# Altium footprint library uSimar_Components.PcbLib: 17 footprints (part 1 of 2)
Each footprint in its own frame and in the unit in brackets; x right, y up, seen from the top. Pads: shape width x height; smd on the part's side, far side on the other; paste and mask are expansions set on the pad; w line width, h text height; cw(c..) or ccw(c..) is an arc to the next point about the centre after c.
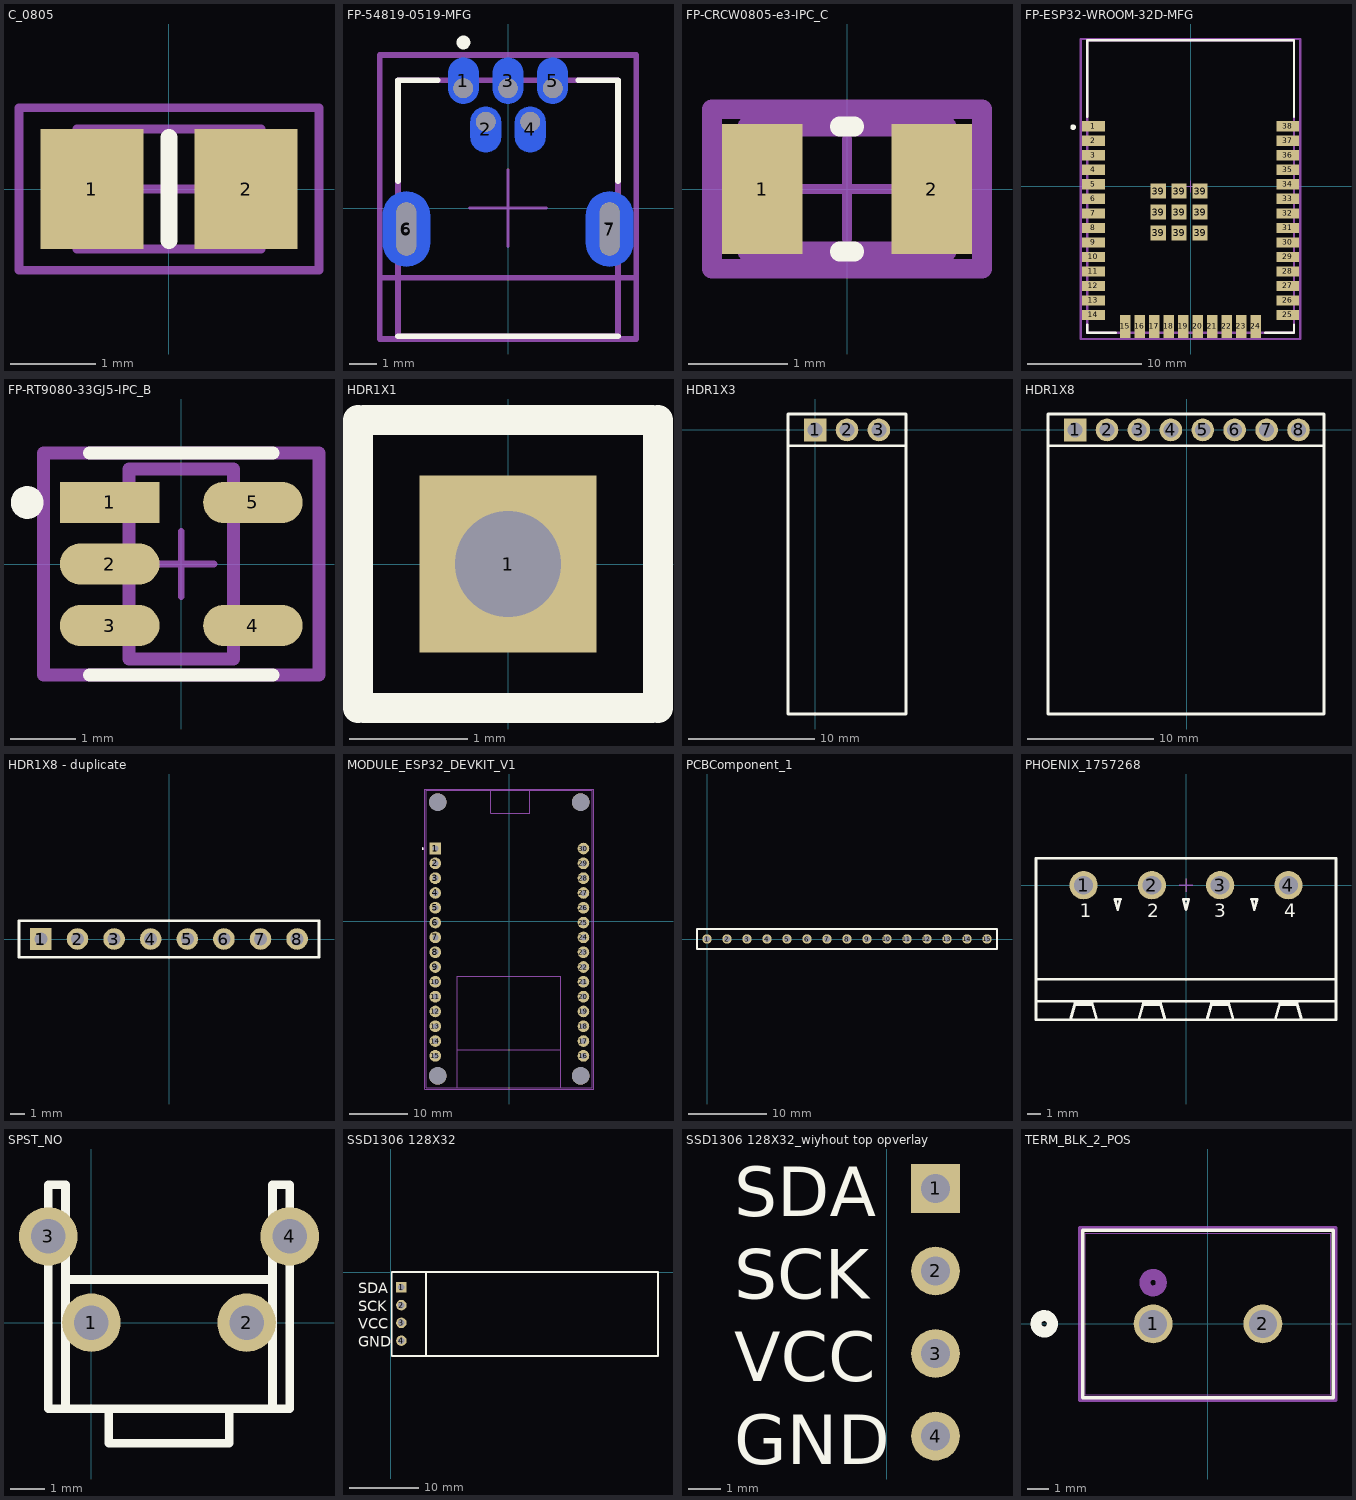
[diagram p0: the footprints below, top view; thin cyan lines are the x and y axes]

## C_0805 [mm] "Chip Capacitor, Body 2.0x1.2mm, IPC Medium Density"
height 0.7
pads (2):
  rect 1.2x1.4 smd: 1(-0.9,0) 2(0.9,0)
Top Overlay:
  lines w0.2: 0,-0.6 0,0.6
Mechanical 13:
  lines w0.1: -1.075,-0.7 -1.075,0.7 1.075,0.7 1.075,-0.7 -1.075,-0.7
Mechanical 15:
  lines w0.1: -0.5,0 0.5,0 ; 0,-0.5 0,0.5 ; -1.75,-0.95 1.75,-0.95 1.75,0.95 -1.75,0.95 -1.75,-0.95
3D body "User Library-C0805-2.step": height 0.8, standoff 0, extent -0.975,-0.625 1.025,0.625

## FP-54819-0519-MFG [mm]
pads (9):
  rrect100% 1.1x1.65 smd far side paste-1000 mask+0: 1(-1.6,4.575) 2(-0.8,2.825) 3(0,4.575) 4(0.8,2.825) 5(1.6,4.575)
  rrect100% 0.7x1.9 hole 1.9 slot 0.7 at 0 deg paste-1000 mask+0: 6(-3.65,-0.75) 7(3.65,-0.75)
  rrect100% 1.7x2.7 smd far side paste-1000 mask+0: 6(-3.65,-0.75) 7(3.65,-0.75)
via 1.6,4.3 diameter 0.7 hole 0.7
via 0.8,3.1 diameter 0.7 hole 0.7
via 0,4.3 diameter 0.7 hole 0.7
via -0.8,3.1 diameter 0.7 hole 0.7
via -1.6,4.3 diameter 0.7 hole 0.7
Top Overlay:
  circle w0.25: c-1.6,5.95 r0.125
  lines w0.2: -3.95,-4.6 3.95,-4.6 ; -3.95,0.975 -3.95,4.6 -2.525,4.6 ; 2.525,4.6 3.95,4.6 3.95,0.975
Top 3D Body:
  lines w0.2: -4.6,-2.5 4.6,-2.5 ; -3.95,-4.6 3.95,-4.6 3.95,4.6 -3.95,4.6 -3.95,-4.6
Top Courtyard:
  lines w0.2: -4.6,-4.7 4.6,-4.7 4.6,5.5 -4.6,5.5 -4.6,-4.7
Top Assembly:
  lines w0.2: -4.6,-4.7 4.6,-4.7 4.6,5.5 -4.6,5.5 -4.6,-4.7
  text ".Designator" at 0,0.588 h1
Top Component Center:
  lines w0.1: -1.38,0 1.38,0 ; 0,-1.38 0,1.38
3D body "Conn_Molex_54819-0519_eec.STEP": height 0.25, standoff 0, extent -4.6,-4.7 4.6,5.5

## FP-CRCW0805-e3-IPC_C [mil]
pads (2):
  rect 31.75x51.5 smd paste+0 mask+0: 1(-33.5,0) 2(33.5,0)
Top Overlay:
  lines w7.87: -2.86,-24.61 2.86,-24.61 ; -2.86,24.61 2.86,24.61
Top 3D Body:
  lines w7.87: -39.37,-24.61 -39.37,24.61 39.37,24.61 39.37,-24.61 -39.37,-24.61
Top Courtyard:
  lines w7.87: -53.31,-31.5 -53.31,31.5 53.31,31.5 53.31,-31.5 -53.31,-31.5
Top Assembly:
  lines w7.87: -53.31,-31.5 -53.31,31.5 53.31,31.5 53.31,-31.5 -53.31,-31.5
Top Component Center:
  lines w3.94: -19.68,0 19.68,0 ; 0,-19.68 0,19.68
3D body "Res_Vishay_CRCW0805100KFKEA_eec.STEP": height 10, standoff 0, extent -53.31,-31.5 53.31,31.5

## FP-ESP32-WROOM-32D-MFG [mm]
pads (47):
  rect 2x0.9 smd paste+0 mask+0: 1(-8.5,5.26) 2(-8.5,3.99) 3(-8.5,2.72) 4(-8.5,1.45) 5(-8.5,0.18) 6(-8.5,-1.09) 7(-8.5,-2.36) 8(-8.5,-3.63) 9(-8.5,-4.9) 10(-8.5,-6.17) 11(-8.5,-7.44) 12(-8.5,-8.71) 13(-8.5,-9.98) 14(-8.5,-11.25) 25(8.5,-11.25) 26(8.5,-9.98) 27(8.5,-8.71) 28(8.5,-7.44) 29(8.5,-6.17) 30(8.5,-4.9) 31(8.5,-3.63) 32(8.5,-2.36) 33(8.5,-1.09) 34(8.5,0.18) 35(8.5,1.45) 36(8.5,2.72) 37(8.5,3.99) 38(8.5,5.26)
  rect 0.9x2 smd paste+0 mask+0: 15(-5.715,-12.25) 16(-4.445,-12.25) 17(-3.175,-12.25) 18(-1.905,-12.25) 19(-0.635,-12.25) 20(0.635,-12.25) 21(1.905,-12.25) 22(3.175,-12.25) 23(4.445,-12.25) 24(5.715,-12.25)
  rect 1.33x1.33 smd paste+0 mask+0: 39(-2.835,-4.075) 39(-2.835,-2.24) 39(-2.835,-0.405) 39(-1,-4.075) 39(-1,-2.24) 39(-1,-0.405) 39(0.835,-4.075) 39(0.835,-2.24) 39(0.835,-0.405)
Top Overlay:
  circle w0.25: c-10.275,5.185 r0.125
  lines w0.2: -9.05,-12.075 -9.05,-12.8 -6.54,-12.8 ; -9.05,6.085 -9.05,12.8 9.05,12.8 9.05,6.085 ; 6.54,-12.8 9.05,-12.8 9.05,-12.075
Top 3D Body:
  lines w0.2: -9.05,-12.8 9.05,-12.8 9.05,12.8 -9.05,12.8 -9.05,-12.8
Top Courtyard:
  lines w0.2: -9.6,-13.35 9.6,-13.35 9.6,12.9 -9.6,12.9 -9.6,-13.35
Top Assembly:
  lines w0.2: -9.6,-13.35 9.6,-13.35 9.6,12.9 -9.6,12.9 -9.6,-13.35
  text ".Designator" at 0,-0.037 h1
Top Component Center:
  lines w0.1: -0.5,0 0.5,0 ; 0,-0.5 0,0.5
3D body "UNK_Espressif_Systems_ESP32-WROOM-32D_eec.STEP": height 0.25, standoff 0, extent -9.6,-13.35 9.6,12.9

## FP-RT9080-33GJ5-IPC_B [mm]
pads (5):
  rect 1.52x0.628 smd paste+0 mask+0: 1(-1.093,0.94)
  rrect100% 1.52x0.628 smd paste+0 mask+0: 2(-1.093,0) 3(-1.093,-0.94) 4(1.093,-0.94) 5(1.093,0.94)
Top Overlay:
  circle w0.25: c-2.353,0.94 r0.125
  lines w0.2: -1.398,-1.698 1.398,-1.698 ; -1.398,1.698 1.398,1.698
Top 3D Body:
  lines w0.2: -0.8,-1.448 0.8,-1.448 0.8,1.448 -0.8,1.448 -0.8,-1.448
Top Courtyard:
  lines w0.2: -2.103,-1.698 2.103,-1.698 2.103,1.698 -2.103,1.698 -2.103,-1.698
Top Assembly:
  lines w0.2: -2.103,-1.698 2.103,-1.698 2.103,1.698 -2.103,1.698 -2.103,-1.698
  text ".Designator" at 0,0 h1
Top Component Center:
  lines w0.1: -0.5,0 0.5,0 ; 0,-0.5 0,0.5
3D body "IC_Richtek_RT9080-33GJ5_eec.STEP": height 0.25, standoff 0, extent -2.103,-1.698 2.103,1.698

## HDR1X1 [mm] "Connector; Header; 3 Position"
height 8.38
pads (1):
  rect 1.5x1.5 hole 0.9: 1(0,0)
Top Overlay:
  lines w0.254: -1.27,-1.22 -1.27,1.22 ; -1.22,-1.22 1.22,-1.22 ; -1.22,1.22 1.22,1.22 ; 1.27,-1.22 1.27,1.22
3D body "header 1x1.step": height 6.01, standoff -2.69, extent -0.984,-1.016 1.016,0.984

## HDR1X3 [mm] "Connector; Header; 3 Position"
height 8.38
pads (3):
  rect 1.8x1.8 hole 1.2: 1(0,0)
  round 1.8 hole 1.2: 2(2.54,0) 3(5.08,0)
Top Overlay:
  lines w0.2: -2.159,-1.27 7.239,-1.27 ; -1.27,1.27 6.35,1.27
  lines w0.254: -2.159,-22.606 -2.159,1.27 7.239,1.27 7.239,-22.606 -2.159,-22.606
3D body "Connector 3X1.step": height 11.75, standoff -3.5, extent -2.16,-22.594 7.24,1.206

## HDR1X8 [mm] "Connector; Header; 5 Position"
height 8.5
pads (8):
  rect 1.8x1.8 hole 1.2: 1(-8.89,0)
  round 1.8 hole 1.2: 2(-6.35,0) 3(-3.81,0) 4(-1.27,0) 5(1.27,0) 6(3.81,0) 7(6.35,0) 8(8.89,0)
Top Overlay:
  lines w0.2: -11.049,-1.27 10.922,-1.27 ; -10.41,1.27 10.41,1.27
  lines w0.254: -11.05,1.27 10.922,1.27 10.922,-22.606 -11.049,-22.606 -11.049,1.27 ; -10.922,1.27 -10.541,1.27
3D body "Connector 8X1.step": height 11.75, standoff -3.5, extent -10.95,-22.594 10.95,1.206

## HDR1X8 - duplicate [mm] "Connector; Header; 5 Position"
height 8.5
pads (8):
  rect 1.5x1.5 hole 0.9: 1(-8.89,0)
  round 1.5 hole 0.9: 2(-6.35,0) 3(-3.81,0) 4(-1.27,0) 5(1.27,0) 6(3.81,0) 7(6.35,0) 8(8.89,0)
Top Overlay:
  lines w0.2: -10.41,-1.27 -10.41,1.27 10.41,1.27 10.41,-1.27 -10.41,-1.27
3D body "_ _ _C081LFBN-RC.STEP": height 8.51, standoff -3.19, extent -10.41,-1.27 10.41,1.27

## MODULE_ESP32_DEVKIT_V1 [mm]
height 6.8
pads (34):
  rect 2x2 / inner round 2 / far side rect 2x2 hole 1.02: 1(-12.7,12.467)
  round 2 hole 1.02: 2(-12.7,9.927) 3(-12.7,7.387) 4(-12.7,4.847) 5(-12.7,2.307) 6(-12.7,-0.233) 7(-12.7,-2.773) 8(-12.7,-5.313) 9(-12.7,-7.853) 10(-12.7,-10.393) 11(-12.7,-12.933) 12(-12.7,-15.473) 13(-12.7,-18.013) 14(-12.7,-20.553) 15(-12.7,-23.093) 16(12.7,-23.093) 17(12.7,-20.553) 18(12.7,-18.013) 19(12.7,-15.473) 20(12.7,-12.933) 21(12.7,-10.393) 22(12.7,-7.853) 23(12.7,-5.313) 24(12.7,-2.773) 25(12.7,-0.233) 26(12.7,2.307) 27(12.7,4.847) 28(12.7,7.387) 29(12.7,9.927) 30(12.7,12.467)
  round 3 hole 3 unplated: ""(-12.28,-26.523) ""(-12.28,20.427) ""(12.23,-26.523) ""(12.23,20.427)
Top Overlay:
  circle w0.2: c-14.85,12.467 r0.1
Mechanical 13:
  circle w0.2: c-14.85,12.467 r0.1
  lines w0.127: -8.91,-28.523 -8.91,-22.033 ; -8.91,-28.523 8.78,-28.523 ; -8.91,-28.523 -14.28,-28.523 -14.28,22.427 -3.211,22.427 ; -8.91,-22.033 8.78,-22.033 ; -8.91,-22.033 -8.91,-9.403 8.78,-9.403 8.78,-22.033 ; -3.211,22.427 -3.211,18.537 3.5,18.537 3.5,22.427 ; -3.211,22.427 3.5,22.427 ; 3.5,22.427 14.23,22.427 14.23,-28.523 8.78,-28.523 ; 8.78,-28.523 8.78,-22.033
Mechanical 15:
  lines w0.05: -14.53,-28.773 14.48,-28.773 14.48,22.677 -14.53,22.677 -14.53,-28.773
3D body "ESP32-DEVKIT-V0-HEADER-1x15.step": height 16.1, standoff -3.1, extent -14.657,-28.386 13.843,22.544

## PCBComponent_1 [mm]
pads (15):
  round 1.2 hole 0.7: 1(0,0) 2(2.54,0) 3(5.08,0) 4(7.62,0) 5(10.16,0) 6(12.7,0) 7(15.24,0) 8(17.78,0) 9(20.32,0) 10(22.86,0) 11(25.4,0) 12(27.94,0) 13(30.48,0) 14(33.02,0) 15(35.56,0)
Top Overlay:
  lines w0.2: -1.27,-1.27 36.83,-1.27 36.83,1.27 -1.27,1.27 -1.27,-1.27
3D body "Female2.54MM1x15x10MM.step": height 8, standoff -10, extent -1.27,-1.27 36.83,1.27

## PHOENIX_1757268 [mm] "PHOENIX MSTBA Serie, Pitch 5.08mm, 12A, 250V, 4 Positions Header"
height 8.6
pads (4):
  round 2.1 hole 1.4: 1(-7.62,0) 2(-2.54,0) 3(2.54,0) 4(7.62,0)
Top Overlay:
  lines w0.2: -11.16,-8.626 11.16,-8.626 ; -11.16,-7 11.16,-7 ; -8.595,-10 -8.225,-8.7 -7.015,-8.7 -6.645,-10 ; -8.276,-8.88 -6.964,-8.88 ; -3.515,-10 -3.145,-8.7 -1.935,-8.7 -1.565,-10 ; -3.196,-8.88 -1.884,-8.88 ; 1.565,-10 1.935,-8.7 3.145,-8.7 3.515,-10 ; 1.884,-8.88 3.196,-8.88 ; 6.645,-10 7.015,-8.7 8.225,-8.7 8.595,-10 ; 6.964,-8.88 8.276,-8.88 ; -11.16,-10 11.16,-10 11.16,2 -11.16,2 -11.16,-10 ; -5.281,-1.05 -5.08,-1.8 -4.879,-1.05 -5.281,-1.05 ; -0.201,-1.05 0,-1.8 0.201,-1.05 -0.201,-1.05 ; 4.879,-1.05 5.08,-1.8 5.281,-1.05 4.879,-1.05
  text "3" at 2.1,-2.4 h1
  text "2" at -2.9,-2.4 h1
  text "1" at -7.9,-2.4 h1
  text "4" at 7.3,-2.4 h1
Mechanical 8:
  lines w0.1: -8.12,0 -7.62,0 ; -7.62,-0.5 -7.62,0 ; -7.62,0.5 -7.62,0 ; -7.12,0 -7.62,0 ; -3.04,0 -2.54,0 ; -2.54,-0.5 -2.54,0 ; -2.54,0.5 -2.54,0 ; -2.04,0 -2.54,0 ; -0.5,0 0,0 ; 0,-0.5 0,0 ; 0,0.5 0,0 ; 0.5,0 0,0 ; 2.04,0 2.54,0 ; 2.54,-0.5 2.54,0 ; 2.54,0.5 2.54,0 ; 3.04,0 2.54,0 ; 7.12,0 7.62,0 ; 7.62,-0.5 7.62,0 ; 7.62,0.5 7.62,0 ; 8.12,0 7.62,0
Mechanical 14:
  lines w0.1: -11.16,-8.626 11.16,-8.626 ; -11.16,-7 11.16,-7 ; -8.595,-10 -8.225,-8.7 -7.015,-8.7 -6.645,-10 ; -8.276,-8.88 -6.964,-8.88 ; -7.865,-8.7 -7.852,-8.75 -7.388,-8.75 -7.375,-8.7 ; -3.515,-10 -3.145,-8.7 -1.935,-8.7 -1.565,-10 ; -3.196,-8.88 -1.884,-8.88 ; -2.785,-8.7 -2.772,-8.75 -2.308,-8.75 -2.295,-8.7 ; 1.565,-10 1.935,-8.7 3.145,-8.7 3.515,-10 ; 1.884,-8.88 3.196,-8.88 ; 2.295,-8.7 2.308,-8.75 2.772,-8.75 2.785,-8.7 ; 6.645,-10 7.015,-8.7 8.225,-8.7 8.595,-10 ; 6.964,-8.88 8.276,-8.88 ; 7.375,-8.7 7.388,-8.75 7.852,-8.75 7.865,-8.7 ; -11.16,-10 11.16,-10 11.16,2 -11.16,2 -11.16,-10 ; -5.281,-1.05 -5.08,-1.8 -4.879,-1.05 -5.281,-1.05 ; -0.201,-1.05 0,-1.8 0.201,-1.05 -0.201,-1.05 ; 4.879,-1.05 5.08,-1.8 5.281,-1.05 4.879,-1.05
3D body "PHOENIX_1757268.stp": height 8.6, standoff -3.5, extent -11.16,-10 11.16,2.002

## SPST_NO [mm] "Tactile Switch SPST-NO Side Actuated Through Hole, Right Angle"
pads (4):
  round 1.7 hole 1: 1(0,0) 2(4.5,0) 3(-1.25,2.5) 4(5.75,2.5)
Top Overlay:
  lines w0.254: 0.5,-2.5 0.5,-3.5 4,-3.5 4,-2.5 ; -0.75,-2.5 5.25,-2.5 ; -0.75,-2.5 -0.75,1.25 ; -0.75,-2.5 -1.25,-2.5 -1.25,4 -0.75,4 -0.75,1.25 ; -0.75,1.25 5.25,1.25 ; 5.25,-2.5 5.25,1.25 ; 5.25,-2.5 5.75,-2.5 5.75,4 5.25,4 5.25,1.25
3D body "TL1105VF100Q--3DModel-STEP-520916.STEP": height 7.1, standoff -3.9, extent -1.997,-3.84 6.398,4.01

## SSD1306 128X32 [mm] "Connector; Header; 4 Position"
height 8.38
pads (4):
  rect 1.5x1.5 hole 0.9: 1(1.5,-2.19)
  round 1.5 hole 0.9: 2(1.5,-4.73) 3(1.5,-7.27) 4(1.5,-9.81)
Top Overlay:
  lines w0.254: 5,-12 5,0 ; 0.127,-12 38.163,-12 38.163,0 0.127,0 0.127,-12
  text "GND" at -4.699,-10.668 h1.52
  text "VCC" at -4.699,-8.128 h1.52
  text "SCK" at -4.699,-5.588 h1.52
  text "SDA" at -4.699,-3.048 h1.52
3D body "DISPLAY-OLED-128x32-HEADER-1x4.step": height 15.31, standoff -2.19, extent 0.254,-12.002 38.254,-0.001

## SSD1306 128X32_wiyhout top opverlay [mm] "Connector; Header; 4 Position"
height 8.38
pads (4):
  rect 1.5x1.5 hole 0.9: 1(1.5,-2.19)
  round 1.5 hole 0.9: 2(1.5,-4.73) 3(1.5,-7.27) 4(1.5,-9.81)
Top Overlay:
  text "GND" at -4.699,-10.668 h1.52
  text "VCC" at -4.699,-8.128 h1.52
  text "SCK" at -4.699,-5.588 h1.52
  text "SDA" at -4.699,-3.048 h1.52
3D body "DISPLAY-OLED-128x32-HEADER-1x4.step": height 15.31, standoff -2.19, extent 0.254,-12.002 38.254,-0.001

## TERM_BLK_2_POS [mil]
pads (2):
  round 71 hole 51 mask+0: 1(-100,0) 2(100,0)
Top Overlay:
  circle w20: c-298.5,0 r15
  lines w6: -228.5,-134.65 228.5,-134.65 228.5,170.35 -228.5,170.35 -228.5,-134.65
Bottom Overlay:
  circle w20: c-298.5,0 r15
Mechanical 13:
  circle w20: c-100,75 r15
  lines w1: -223.5,-129.65 223.5,-129.65 223.5,165.35 -223.5,165.35 -223.5,-129.65
Mechanical 15:
  lines w6: -233.5,-139.65 -233.5,175.35 233.5,175.35 233.5,-139.65 -233.5,-139.65
3D body: height 10, standoff 0, extent -100,0 -90,10
3D body "User Library-Terminal block 2 POS.STEP": height 393.7, standoff -120, extent -199.99,-125.98 200.01,169.29